# Altium footprint library Amirreza.PcbLib: 524 footprints (part 3 of 33)
Each footprint in its own frame and in the unit in brackets; x right, y up, seen from the top. Pads: shape width x height; smd on the part's side, far side on the other; paste and mask are expansions set on the pad; w line width, h text height; cw(c..) or ccw(c..) is an arc to the next point about the centre after c.
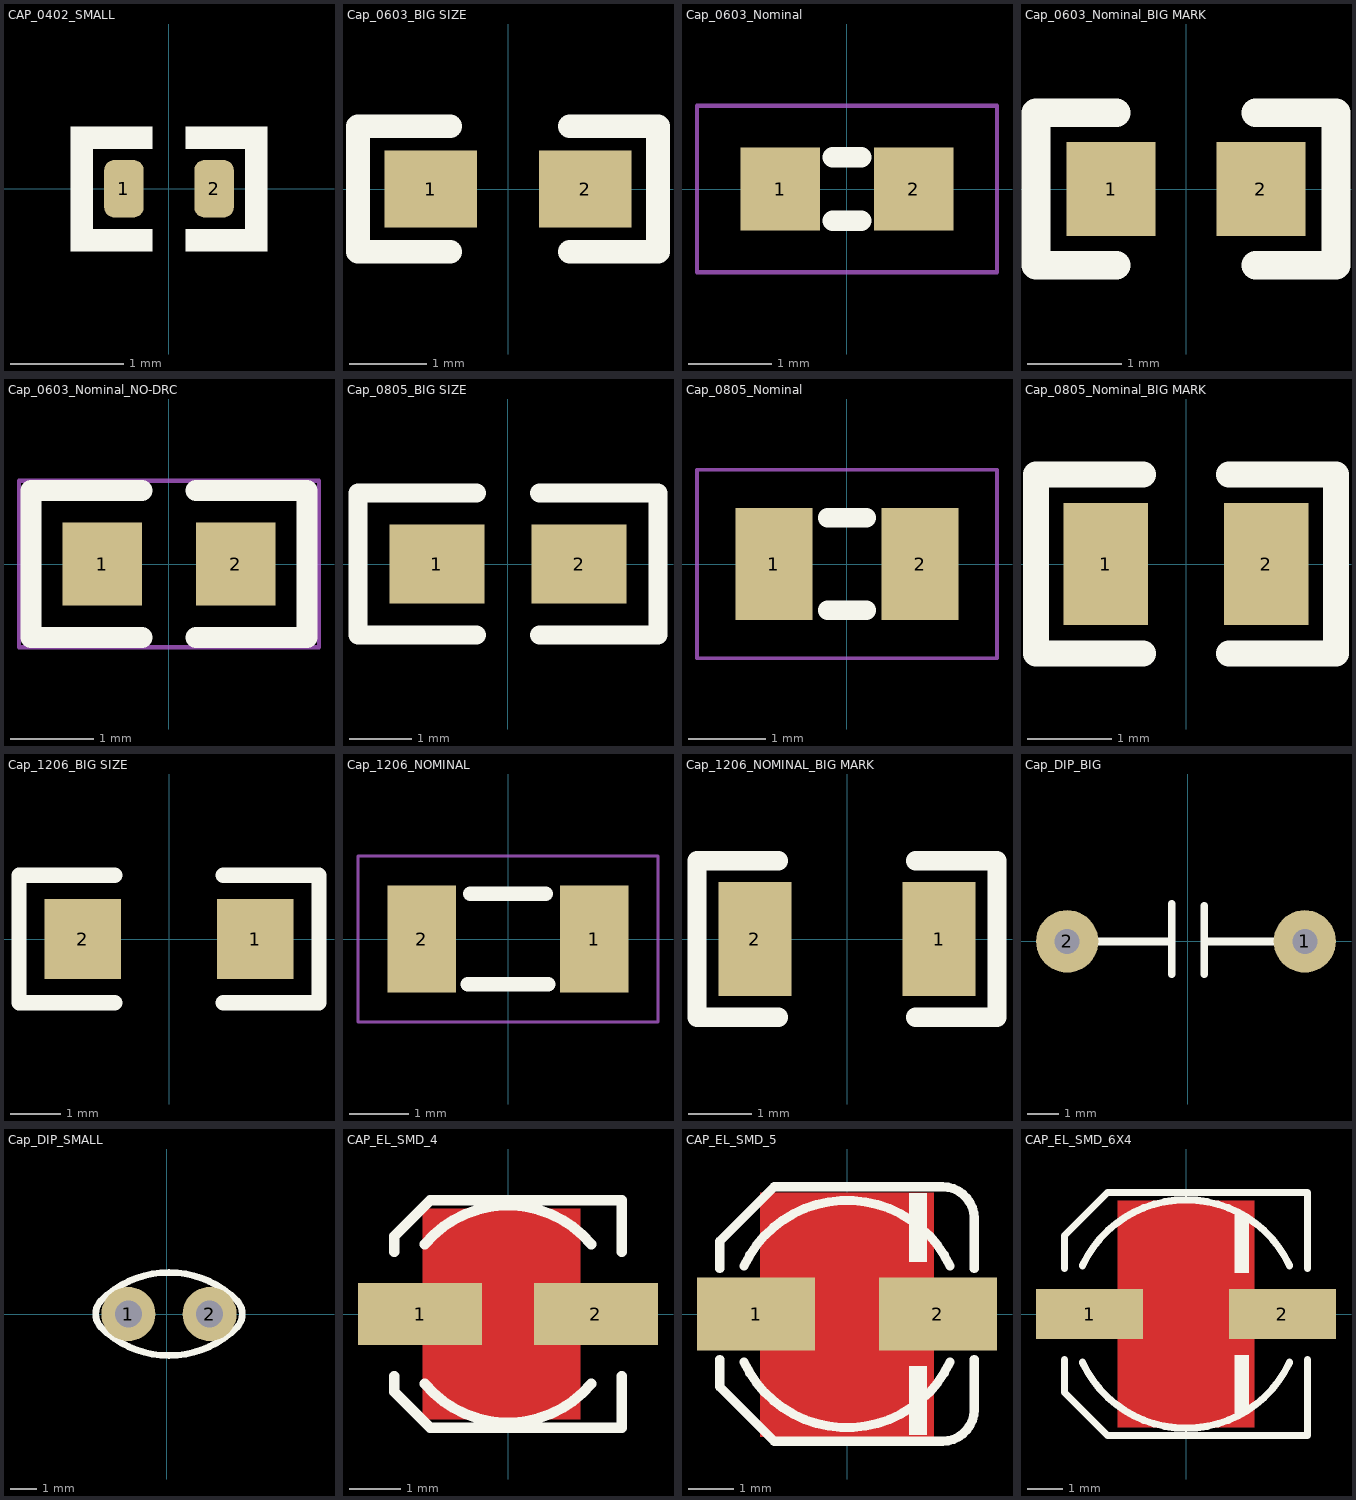
[diagram p2: the footprints below, top view; thin cyan lines are the x and y axes]

## CAP_0402_SMALL [mm]
pads (2):
  rrect50% 0.35x0.508 smd mask+0.075: 1(-0.4,0) 2(0.4,0)
Top Overlay:
  region: -0.675,-0.558 -0.675,0.554 -0.875,0.554 -0.875,-0.558
  rectangle: -0.875,0.354 -0.145,0.554
  rectangle: -0.875,-0.558 -0.145,-0.358
  region: 0.875,-0.558 0.875,0.554 0.675,0.554 0.675,-0.558
  region: 0.875,0.554 0.145,0.554 0.145,0.354 0.875,0.354
  region: 0.875,-0.358 0.145,-0.358 0.145,-0.558 0.875,-0.558
3D body "capacitor_rnd150mt15n100f100.stp": height 0.5, standoff 0, extent -0.503,-0.249 0.497,0.251

## Cap_0603_BIG SIZE [mm]
pads (2):
  rect 1.2x1 smd: 1(-1,0) 2(1,0)
Top Overlay:
  lines w0.305: -1.94,-0.813 -1.94,0.813 ; -1.889,-0.813 -0.746,-0.813 ; -1.889,0.813 -0.746,0.813 ; 0.797,-0.813 1.94,-0.813 1.94,0.813 0.797,0.813
3D body "User Library-0603 SMD Capacitor.step": height 0.3, standoff 0, extent -0.8,-0.4 0.8,0.4

## Cap_0603_Nominal [mm]
pads (2):
  rect 0.95x1 smd: 1(-0.8,0) 2(0.8,0)
Top Overlay:
  lines w0.25: -0.171,-0.381 0.171,-0.381 ; -0.171,0.381 0.171,0.381
Mechanical 13:
  lines w0.05: -1.8,-1 -1.8,1 1.8,1 1.8,-1 -1.8,-1
3D body "User Library-0603 SMD Capacitor.step": height 0.3, standoff 0, extent -0.8,-0.4 0.8,0.4

## Cap_0603_Nominal_BIG MARK [mm]
pads (2):
  rect 0.95x1 smd: 1(-0.8,0) 2(0.8,0)
Top Overlay:
  lines w0.305: -0.746,-0.813 -1.6,-0.813 -1.6,0.813 -0.746,0.813 ; 0.746,-0.813 1.6,-0.813 1.6,0.813 0.746,0.813
3D body "User Library-0603 SMD Capacitor.step": height 0.3, standoff 0, extent -0.8,-0.4 0.8,0.4

## Cap_0603_Nominal_NO-DRC [mm]
pads (2):
  rect 0.95x1 smd: 1(-0.8,0) 2(0.8,0)
Top Overlay:
  lines w0.254: -1.656,-0.881 -1.656,0.881 ; -1.647,-0.881 -0.325,-0.881 ; -1.647,0.881 -0.326,0.881 ; 0.325,-0.881 1.647,-0.881 ; 0.326,0.881 1.647,0.881 ; 1.656,-0.881 1.656,0.881
Mechanical 13:
  lines w0.05: -1.8,-1 -1.8,1 1.8,1 1.8,-1 -1.8,-1
3D body "User Library-0603 SMD Capacitor.step": height 0.3, standoff 0, extent -0.8,-0.4 0.8,0.4

## Cap_0805_BIG SIZE [mil]
pads (2):
  rect 60x50 smd: 1(-45,0) 2(45,0)
Top Overlay:
  lines w12: -20,-45 -95,-45 -95,45 -20,45 ; 20,-45 95,-45 95,45 20,45
3D body "User Library-User Library-0805(2012M) Cap.step": height 50.59, standoff -0.2, extent -39.36,-25.39 39.38,25.4

## Cap_0805_Nominal [mm]
pads (2):
  rect 1x1.45 smd: 1(-0.95,0) 2(0.95,0)
Top Overlay:
  lines w0.25: -0.254,-0.6 0.254,-0.6 ; -0.254,0.6 0.254,0.6
Mechanical 13:
  lines w0.05: -1.95,-1.225 1.95,-1.225 1.95,1.225 -1.95,1.225 -1.95,-1.225
3D body "User Library-User Library-0805(2012M) Cap.step": height 1.29, standoff 0, extent -1,-0.645 1,0.645

## Cap_0805_Nominal_BIG MARK [mm]
pads (2):
  rect 1x1.45 smd: 1(-0.95,0) 2(0.95,0)
Top Overlay:
  lines w0.305: -0.507,-1.06 -1.778,-1.06 -1.778,1.06 -0.507,1.06 ; 0.507,-1.06 1.778,-1.06 1.778,1.06 0.507,1.06
3D body "User Library-User Library-0805(2012M) Cap.step": height 1.29, standoff 0, extent -1,-0.645 1,0.645

## Cap_1206_BIG SIZE [mil]
pads (2):
  rect 60x62.99 smd: 1(67.5,0) 2(-67.5,0)
Top Overlay:
  lines w12: -42.5,-50 -117.5,-50 -117.5,50 -42.5,50 ; 42.5,-50 117.5,-50 117.5,50 42.5,50
3D body "User Library-1206 SMD Capacitor.step": height 39.45, standoff 0, extent -62.99,-31.49 63,31.5

## Cap_1206_NOMINAL [mm]
pads (2):
  rect 1.15x1.8 smd: 1(1.45,0) 2(-1.45,0)
Top Overlay:
  lines w0.25: -0.673,-0.762 0.673,-0.762 ; -0.635,0.762 0.635,0.762
Mechanical 13:
  lines w0.05: -2.525,-1.4 -2.525,1.4 2.525,1.4 2.525,-1.4 -2.525,-1.4
3D body "User Library-1206 SMD Capacitor.step": height 1, standoff 0, extent -1.6,-0.8 1.6,0.8

## Cap_1206_NOMINAL_BIG MARK [mm]
pads (2):
  rect 1.15x1.8 smd: 1(1.45,0) 2(-1.45,0)
Top Overlay:
  lines w0.305: -1.079,-1.23 -2.362,-1.23 -2.362,1.23 -1.079,1.23 ; 1.078,-1.23 2.362,-1.23 2.362,1.23 1.078,1.23
3D body "User Library-1206 SMD Capacitor.step": height 1, standoff 0, extent -1.6,-0.8 1.6,0.8

## Cap_DIP_BIG [mm]
pads (2):
  round 2 hole 0.8: 1(3.759,0) 2(-3.861,0)
Top Overlay:
  lines w0.254: -3.861,0 -0.508,0 ; -0.508,-1.041 -0.508,1.194 ; 0.533,-1.041 0.533,1.143 ; 0.533,0 3.759,0

## Cap_DIP_SMALL [mil]
pads (2):
  round 80 hole 40: 1(-57,0) 2(63,0)
Top Overlay:
  lines w10: -97,-20 ccw(c3,80) 103,-20 ccw(c83,0) 103,20 ccw(c3,-80) -97,20 ccw(c-77,0) -97,-20
3D body "Cap_Vishay_BC_Components_K105Z20Y5VF5TL2_eec.STEP": height 261.81, standoff -155.51, extent -98.42,-63.07 98.43,63

## CAP_EL_SMD_4 [mm] "Electrolytic Cap, D: 4.3mm, Size B, 5.5mm Height"
height 5.5
pads (2):
  rect 2.4x1.2 smd: 1(-1.7,0) 2(1.7,0)
Top Layer:
  pour cut-out: 1.397,2.032 1.397,-2.032 -1.651,-2.032 -1.651,2.032
Top Overlay:
  lines w0.2: -2.2,-1.2 -2.2,-1.5 -1.5,-2.2 2.2,-2.2 2.2,-1.2 ; -2.2,1.2 -2.2,1.5 -1.5,2.2 2.2,2.2 2.2,1.2 ; -1.609,-1.35 ccw(c0,0) 1.609,-1.35 ; -1.609,1.35 cw(c0,0) 1.609,1.35
3D body "4x5.5x1.stp": height 5.5, standoff 0, extent -2.5,-2.15 2.5,2.15

## CAP_EL_SMD_5 [mm] "Electrolytic Cap, D: 5.0mm, L: 5.8mm, Size C"
pads (2):
  rect 2.6x1.6 smd: 1(-2,0) 2(2,0)
Top Layer:
  pour cut-out: 1.905,2.667 1.905,-2.7 -1.905,-2.7 -1.905,2.667
Top Overlay:
  rectangle: 1.36,-2.667 1.76,-1.143
  rectangle: 1.36,1.143 1.76,2.667
  lines w0.2: -2.8,-1 -2.8,-1.6 -1.6,-2.8 2.1,-2.8 ccw(c2.1,-2.1) 2.8,-2.1 2.8,-1 ; -2.8,1 -2.8,1.6 -1.6,2.8 2.1,2.8 cw(c2.1,2.1) 2.8,2.1 2.8,1 ; -2.266,-1.057 ccw(c0,0) 2.266,-1.057 ; -2.266,1.057 cw(c0,0) 2.266,1.057
3D body "5x5.8x1.4.stp": height -0.4, standoff -6.2, extent -3,-2.65 3,2.65

## CAP_EL_SMD_6X4 [mm] "Electrolytic Cap, D: 6.3mm L: 3.9mm, Size D"
height 4
pads (2):
  rect 3x1.4 smd: 1(-2.7,0) 2(2.7,0)
Top Layer:
  pour cut-out: 1.905,3.175 1.905,-3.175 -1.905,-3.175 -1.905,3.175
Top Overlay:
  rectangle: 1.36,1.143 1.76,2.8
  rectangle: 1.36,-2.8 1.76,-1.143
  lines w0.2: -3.4,-1.27 -3.4,-2.2 -2.2,-3.4 3.4,-3.4 3.4,-1.27 ; -3.4,1.27 -3.4,2.2 -2.2,3.4 3.4,3.4 3.4,1.27 ; -2.9,-1.352 ccw(c0,0) 2.9,-1.352 ; -2.9,1.352 cw(c0,0) 2.9,1.352
3D body "User Library-CAPSMD6_3x3_9.STEP": height 3.91, standoff 0, extent -3.586,-3.3 3.414,3.3